# Altium footprint library Connectors.PCBLIB: 126 footprints (part 4 of 8)
Each footprint in its own frame and in the unit in brackets; x right, y up, seen from the top. Pads: shape width x height; smd on the part's side, far side on the other; paste and mask are expansions set on the pad; w line width, h text height; cw(c..) or ccw(c..) is an arc to the next point about the centre after c.
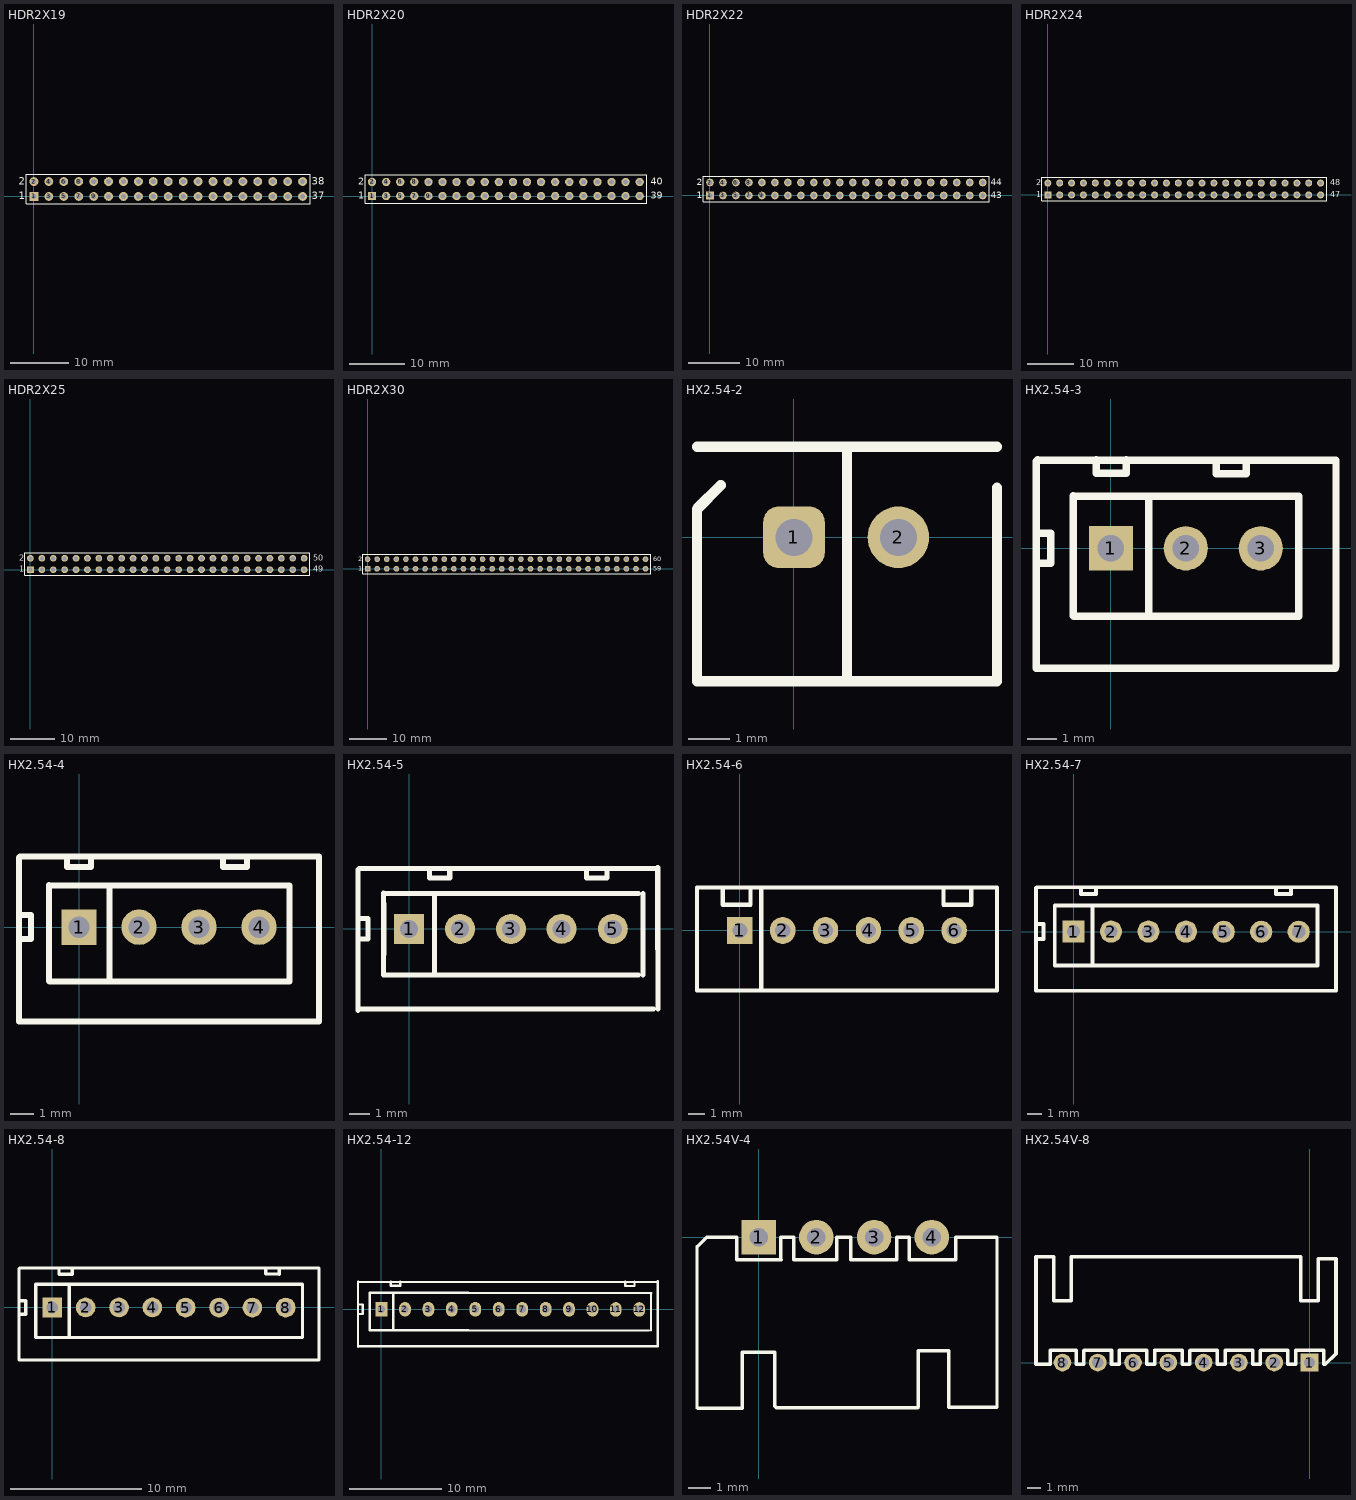
[diagram p3: the footprints below, top view; thin cyan lines are the x and y axes]

## HDR2X19 [mm] "Connector; Header; 19x2 Position"
pads (38):
  rect 1.5x1.5 hole 0.9: 1(0,0)
  round 1.5 hole 0.9: 2(0,2.54) 3(2.54,0) 4(2.54,2.54) 5(5.08,0) 6(5.08,2.54) 7(7.62,0) 8(7.62,2.54) 9(10.16,0) 10(10.16,2.54) 11(12.7,0) 12(12.7,2.54) 13(15.24,0) 14(15.24,2.54) 15(17.78,0) 16(17.78,2.54) 17(20.32,0) 18(20.32,2.54) 19(22.86,0) 20(22.86,2.54) 21(25.4,0) 22(25.4,2.54) 23(27.94,0) 24(27.94,2.54) 25(30.48,0) 26(30.48,2.54) 27(33.02,0) 28(33.02,2.54) 29(35.56,0) 30(35.56,2.54) 31(38.1,0) 32(38.1,2.54) 33(40.64,0) 34(40.64,2.54) 35(43.18,0) 36(43.18,2.54) 37(45.72,0) 38(45.72,2.54)
Top Overlay:
  lines w0.2: -1.27,-1.27 46.99,-1.27 46.99,3.81 -1.27,3.81 -1.27,-1.27
  text "2" at -2.54,2.032 h1.27
  text "1" at -2.54,-0.508 h1.27
  text "37" at 47.244,-0.508 h1.27
  text "38" at 47.244,2.032 h1.27
3D body "HDR2x19.STEP": height 8.54, standoff -3, extent -1.27,-1.27 46.99,3.81

## HDR2X20 [mm] "Connector; Header; 20x2 Position"
pads (40):
  rect 1.5x1.5 hole 0.9: 1(0,0)
  round 1.5 hole 0.9: 2(0,2.54) 3(2.54,0) 4(2.54,2.54) 5(5.08,0) 6(5.08,2.54) 7(7.62,0) 8(7.62,2.54) 9(10.16,0) 10(10.16,2.54) 11(12.7,0) 12(12.7,2.54) 13(15.24,0) 14(15.24,2.54) 15(17.78,0) 16(17.78,2.54) 17(20.32,0) 18(20.32,2.54) 19(22.86,0) 20(22.86,2.54) 21(25.4,0) 22(25.4,2.54) 23(27.94,0) 24(27.94,2.54) 25(30.48,0) 26(30.48,2.54) 27(33.02,0) 28(33.02,2.54) 29(35.56,0) 30(35.56,2.54) 31(38.1,0) 32(38.1,2.54) 33(40.64,0) 34(40.64,2.54) 35(43.18,0) 36(43.18,2.54) 37(45.72,0) 38(45.72,2.54) 39(48.26,0) 40(48.26,2.54)
Top Overlay:
  lines w0.2: -1.27,-1.27 49.53,-1.27 49.53,3.81 -1.27,3.81 -1.27,-1.27
  text "1" at -2.54,-0.508 h1.27
  text "2" at -2.54,2.032 h1.27
  text "40" at 50.292,2.032 h1.27
  text "39" at 50.292,-0.508 h1.27
3D body "HDR2x20.STEP": height 8.54, standoff -3, extent -1.27,-1.27 49.53,3.81

## HDR2X22 [mm] "Connector; Header; 22x2 Position"
pads (44):
  rect 1.5x1.5 hole 0.9: 1(0,0)
  round 1.5 hole 0.9: 2(0,2.54) 3(2.54,0) 4(2.54,2.54) 5(5.08,0) 6(5.08,2.54) 7(7.62,0) 8(7.62,2.54) 9(10.16,0) 10(10.16,2.54) 11(12.7,0) 12(12.7,2.54) 13(15.24,0) 14(15.24,2.54) 15(17.78,0) 16(17.78,2.54) 17(20.32,0) 18(20.32,2.54) 19(22.86,0) 20(22.86,2.54) 21(25.4,0) 22(25.4,2.54) 23(27.94,0) 24(27.94,2.54) 25(30.48,0) 26(30.48,2.54) 27(33.02,0) 28(33.02,2.54) 29(35.56,0) 30(35.56,2.54) 31(38.1,0) 32(38.1,2.54) 33(40.64,0) 34(40.64,2.54) 35(43.18,0) 36(43.18,2.54) 37(45.72,0) 38(45.72,2.54) 39(48.26,0) 40(48.26,2.54) 41(50.8,0) 42(50.8,2.54) 43(53.34,0) 44(53.34,2.54)
Top Overlay:
  lines w0.2: -1.27,-1.27 -1.27,3.81 54.61,3.81 54.61,-1.27 -1.27,-1.27
  text "43" at 54.864,-0.508 h1.27
  text "44" at 54.864,2.032 h1.27
  text "1" at -2.54,-0.508 h1.27
  text "2" at -2.54,2.032 h1.27
3D body "HDR2x22.STEP": height 8.54, standoff -3, extent -1.27,-1.27 54.61,3.81

## HDR2X24 [mm] "Connector; Header; 24x2 Position"
pads (48):
  rect 1.5x1.5 hole 0.9: 1(0,0)
  round 1.5 hole 0.9: 2(0,2.54) 3(2.54,0) 4(2.54,2.54) 5(5.08,0) 6(5.08,2.54) 7(7.62,0) 8(7.62,2.54) 9(10.16,0) 10(10.16,2.54) 11(12.7,0) 12(12.7,2.54) 13(15.24,0) 14(15.24,2.54) 15(17.78,0) 16(17.78,2.54) 17(20.32,0) 18(20.32,2.54) 19(22.86,0) 20(22.86,2.54) 21(25.4,0) 22(25.4,2.54) 23(27.94,0) 24(27.94,2.54) 25(30.48,0) 26(30.48,2.54) 27(33.02,0) 28(33.02,2.54) 29(35.56,0) 30(35.56,2.54) 31(38.1,0) 32(38.1,2.54) 33(40.64,0) 34(40.64,2.54) 35(43.18,0) 36(43.18,2.54) 37(45.72,0) 38(45.72,2.54) 39(48.26,0) 40(48.26,2.54) 41(50.8,0) 42(50.8,2.54) 43(53.34,0) 44(53.34,2.54) 45(55.88,0) 46(55.88,2.54) 47(58.42,0) 48(58.42,2.54)
Top Overlay:
  lines w0.2: -1.27,-1.27 -1.27,3.81 59.69,3.81 59.69,-1.27 -1.27,-1.27
  text "47" at 60.452,-0.508 h1.27
  text "48" at 60.452,2.032 h1.27
  text "1" at -2.54,-0.508 h1.27
  text "2" at -2.54,2.032 h1.27
3D body "HDR2x24.STEP": height 8.54, standoff -3, extent -1.27,-1.27 59.69,3.81

## HDR2X25 [mm] "Connector; Header; 25x2 Position"
pads (50):
  rect 1.5x1.5 hole 0.9: 1(0,0)
  round 1.5 hole 0.9: 2(0,2.54) 3(2.54,0) 4(2.54,2.54) 5(5.08,0) 6(5.08,2.54) 7(7.62,0) 8(7.62,2.54) 9(10.16,0) 10(10.16,2.54) 11(12.7,0) 12(12.7,2.54) 13(15.24,0) 14(15.24,2.54) 15(17.78,0) 16(17.78,2.54) 17(20.32,0) 18(20.32,2.54) 19(22.86,0) 20(22.86,2.54) 21(25.4,0) 22(25.4,2.54) 23(27.94,0) 24(27.94,2.54) 25(30.48,0) 26(30.48,2.54) 27(33.02,0) 28(33.02,2.54) 29(35.56,0) 30(35.56,2.54) 31(38.1,0) 32(38.1,2.54) 33(40.64,0) 34(40.64,2.54) 35(43.18,0) 36(43.18,2.54) 37(45.72,0) 38(45.72,2.54) 39(48.26,0) 40(48.26,2.54) 41(50.8,0) 42(50.8,2.54) 43(53.34,0) 44(53.34,2.54) 45(55.88,0) 46(55.88,2.54) 47(58.42,0) 48(58.42,2.54) 49(60.96,0) 50(60.96,2.54)
Top Overlay:
  lines w0.2: -1.27,-1.27 62.23,-1.27 62.23,3.81 -1.27,3.81 -1.27,-1.27
  text "50" at 62.992,2.032 h1.27
  text "49" at 62.992,-0.508 h1.27
  text "1" at -2.54,-0.508 h1.27
  text "2" at -2.54,2.032 h1.27
3D body "HDR2x25.STEP": height 8.54, standoff -3, extent -1.27,-1.27 62.23,3.81

## HDR2X30 [mm] "Connector; Header; 30x2 Position"
pads (60):
  rect 1.5x1.5 hole 0.9: 1(0,0)
  round 1.5 hole 0.9: 2(0,2.54) 3(2.54,0) 4(2.54,2.54) 5(5.08,0) 6(5.08,2.54) 7(7.62,0) 8(7.62,2.54) 9(10.16,0) 10(10.16,2.54) 11(12.7,0) 12(12.7,2.54) 13(15.24,0) 14(15.24,2.54) 15(17.78,0) 16(17.78,2.54) 17(20.32,0) 18(20.32,2.54) 19(22.86,0) 20(22.86,2.54) 21(25.4,0) 22(25.4,2.54) 23(27.94,0) 24(27.94,2.54) 25(30.48,0) 26(30.48,2.54) 27(33.02,0) 28(33.02,2.54) 29(35.56,0) 30(35.56,2.54) 31(38.1,0) 32(38.1,2.54) 33(40.64,0) 34(40.64,2.54) 35(43.18,0) 36(43.18,2.54) 37(45.72,0) 38(45.72,2.54) 39(48.26,0) 40(48.26,2.54) 41(50.8,0) 42(50.8,2.54) 43(53.34,0) 44(53.34,2.54) 45(55.88,0) 46(55.88,2.54) 47(58.42,0) 48(58.42,2.54) 49(60.96,0) 50(60.96,2.54) 51(63.5,0) 52(63.5,2.54) 53(66.04,0) 54(66.04,2.54) 55(68.58,0) 56(68.58,2.54) 57(71.12,0) 58(71.12,2.54) 59(73.66,0) 60(73.66,2.54)
Top Overlay:
  lines w0.2: -1.27,-1.27 75.06,-1.27 75.06,3.81 -1.27,3.81 -1.27,-1.27
  text "60" at 75.692,2.032 h1.27
  text "59" at 75.692,-0.508 h1.27
  text "1" at -2.54,-0.508 h1.27
  text "2" at -2.54,2.032 h1.27
Bottom Overlay:
  text "1" at -55.88,-0.508 h1.27
3D body "HDR2x30.STEP": height 8.54, standoff -3, extent -1.27,-1.27 74.93,3.81

## HX2.54-2 [mm] "两针白色插座（已加焊）"
pads (2):
  rrect50% 1.5x1.5 hole 0.9: 1(0,0)
  round 1.5 hole 0.9: 2(2.54,0)
Top Overlay:
  lines w0.254: -2.36,2.2 4.94,2.2 ; -1.778,1.27 -2.36,0.688 -2.36,0.635 -2.36,-3.5 4.94,-3.5 4.94,1.206 ; 1.29,-3.5 1.29,2.2
3D body "SIP2_Y.stp": height 7, standoff -3, extent -2.48,-3.55 5.02,2.45

## HX2.54-3 [mm]
pads (3):
  rect 1.5x1.5 hole 0.9: 1(0,0)
  round 1.5 hole 0.9: 2(2.54,0) 3(5.08,0)
Top Overlay:
  lines w0.254: -2.54,-0.508 -2.032,-0.508 -2.032,0.508 -2.54,0.508 ; -2.536,2.54 -2.536,2.95 ; -2.496,2.995 7.633,2.995 7.633,-4.005 ; -1.27,-2.286 -1.27,1.778 ; -1.257,-2.296 6.363,-2.296 ; -1.257,1.768 6.375,1.768 ; -0.504,2.998 -0.504,2.538 0.512,2.538 0.512,2.998 ; 1.283,-2.296 1.283,1.768 ; 3.573,2.995 3.573,2.535 4.589,2.535 4.589,2.995 ; 6.375,-2.299 6.375,1.765 ; 7.607,-4.061 -2.536,-4.061 -2.536,2.95 ; -2.536,2.95 -2.488,2.998 -2.536,2.95
3D body "hx254-3tl_y.stp": height 7, standoff -3, extent -2.409,-3.581 7.591,2.419

## HX2.54-4 [mm]
pads (4):
  rect 1.5x1.5 hole 0.9: 1(0,0)
  round 1.5 hole 0.9: 2(2.54,0) 3(5.08,0) 4(7.62,0)
Top Overlay:
  lines w0.254: -2.54,-0.508 -2.032,-0.508 -2.032,0.508 -2.54,0.508 ; -2.536,-4.002 -2.536,2.95 ; -2.472,-4.002 -2.092,-4.002 10.16,-4.002 10.16,2.998 -2.488,2.998 ; -1.27,-2.286 -1.27,1.778 ; -1.257,-2.296 8.903,-2.296 8.903,1.768 -1.257,1.768 ; -0.504,2.998 -0.504,2.538 0.512,2.538 0.512,2.998 ; 1.283,-2.296 1.283,1.768 ; 6.1,2.998 6.1,2.538 7.116,2.538 7.116,2.998 ; -2.536,2.95 -2.488,2.998 ; -2.536,2.95 -2.488,2.998
3D body "hx254-4tl_y.stp": height 7, standoff -3, extent -2.399,-3.562 10.121,2.438

## HX2.54-5 [mm]
pads (5):
  rect 1.5x1.5 hole 0.9: 1(0,0)
  round 1.5 hole 0.9: 2(2.54,0) 3(5.08,0) 4(7.607,0.006) 5(10.16,0)
Top Overlay:
  lines w0.254: -2.553,-0.502 -2.045,-0.502 -2.045,0.514 -2.553,0.514 ; -2.491,-3.996 12.179,-3.996 ; -2.104,-3.996 -2.484,-3.996 -2.548,-4.06 -2.548,-2.028 -2.548,2.956 -2.5,3.004 12.416,3.014 ; -1.283,-2.28 -1.283,1.784 ; -1.27,-2.29 11.43,-2.29 ; -1.27,-1.27 -1.27,1.27 ; -1.27,1.774 11.43,1.774 ; 1.008,3.004 1.008,2.544 2.024,2.544 2.024,3.004 ; 1.27,-2.29 1.27,1.774 ; 1.27,-1.27 1.27,1.27 ; 8.856,3.004 8.856,2.544 9.872,2.544 9.872,3.004 ; 11.659,-2.29 11.659,1.774 ; 12.403,-1.01 12.403,3.054 ; 12.408,-3.996 12.408,0.004
3D body "hx254-5tl_y.stp": height 7.51, standoff -2.49, extent -2.562,-3.562 12.518,2.438

## HX2.54-6 [mm]
pads (6):
  rect 1.5x1.6 hole 0.9: 1(0,0)
  oval 1.5x1.6 hole 0.9: 2(2.54,0) 3(5.08,0) 4(7.62,0) 5(10.16,0) 6(12.7,0)
Top Overlay:
  lines w0.254: -1.016,2.54 -1.016,1.524 0.635,1.524 0.635,2.54 ; 1.27,-3.556 1.27,2.54 ; 12.065,2.54 12.065,1.524 13.716,1.524 13.716,2.54 ; -2.54,-3.556 15.24,-3.556 15.24,2.54 -2.54,2.54 -2.54,-3.556
3D body "HDR2.54x6.STEP": height 6.1, standoff -2, extent -2.54,-3.632 15.24,2.362

## HX2.54-7 [mm]
pads (7):
  rect 1.5x1.5 hole 0.9: 1(0,0)
  round 1.5 hole 0.9: 2(2.54,0) 3(5.08,0) 4(7.62,0) 5(10.173,-0.01) 6(12.713,-0.01) 7(15.253,-0.01)
Top Overlay:
  lines w0.254: -2.54,-0.508 -2.032,-0.508 -2.032,0.508 -2.54,0.508 ; -1.257,-2.296 16.523,-2.296 16.523,1.768 -1.257,1.768 ; 0.512,2.998 0.512,2.538 1.528,2.538 1.528,2.998 ; 1.283,-2.296 1.283,1.768 ; 9.398,-2.286 -1.27,-2.286 -1.27,1.778 9.398,1.778 ; 13.72,2.998 13.72,2.538 14.736,2.538 14.736,2.998 ; 17.776,-4.002 17.776,2.998 ; 17.78,-4.002 -2.536,-4.002 -2.536,2.95 -2.488,2.998 17.78,2.998
3D body "HDR2.54x7.STEP": height 6.1, standoff -2, extent -2.535,-3.632 17.776,2.362

## HX2.54-8 [mm]
pads (8):
  rect 1.5x1.5 hole 0.9: 1(0,0)
  round 1.5 hole 0.9: 2(2.54,0) 3(5.08,0) 4(7.62,0) 5(10.16,-0.01) 6(12.7,-0.01) 7(15.24,-0.01) 8(17.78,-0.01)
Top Overlay:
  lines w0.254: -2.54,-0.508 -2.032,-0.508 -2.032,0.508 -2.54,0.508 ; 0.512,2.998 0.512,2.538 1.528,2.538 1.528,2.998 ; 1.283,-2.296 1.283,1.768 ; 16.256,3 16.256,2.54 17.272,2.54 ; 17.276,2.538 17.276,2.998 ; 19.063,-2.296 19.063,1.768 ; 19.063,-2.286 -1.27,-2.286 -1.27,1.778 19.063,1.778 ; -2.536,-4.002 20.316,-4.002 20.316,2.998 -2.488,2.998 -2.536,2.95 -2.536,-4.002
3D body "HDR2.54x8.STEP": height 6.1, standoff -2, extent -2.54,-3.632 20.32,2.362

## HX2.54-12 [mil]
pads (12):
  rect 50x62 hole 32: 1(0,0)
  oval 50x62 hole 32: 2(100.5,0.5) 3(200.5,0.5) 4(300,0.73) 5(400.5,0.5) 6(500.5,0.5) 7(600.5,0.5) 8(700.5,0.5) 9(800.5,0.5) 10(900.5,0.5) 11(1000,0) 12(1100,0)
Top Overlay:
  lines w10: -100,-19.26 -80,-19.26 -80,20.74 -100,20.74 ; -97.94,118.76 -99.83,116.87 ; -97.57,-156.83 1180,-156.83 ; -82.35,-156.83 -97.31,-156.83 -99.83,-159.35 -99.83,-79.35 -99.83,116.87 ; -49.5,-89.66 1141,-89.66 ; -49.5,70.34 1150.5,70.34 ; 40.17,118.76 40.17,100.65 80.17,100.65 80.17,118.76 ; 50.5,-89.66 50.5,70.34 ; 370,-89.26 -50,-89.26 -50,70.74 370,70.74 ; 1039.67,118.26 1039.67,100.15 1079.67,100.15 1079.67,118.26 ; 1150,-90.16 1150,69.84 ; 1175.96,116.87 -99.83,116.87 ; 1179.33,-39.76 1179.33,120.24 ; 1179.5,-157.33 1179.5,0.15 ; -49.5,-49.5 -49.5,50.5 -49.5,-49.5 ; 50.5,-49.5 50.5,50.5 50.5,-49.5
3D body "HDR2.54x12.STEP": height 240, standoff -78.74, extent -100,-143 1180,93

## HX2.54V-4 [mil]
pads (4):
  rect 60x60 hole 32: 1(0,0)
  round 60 hole 32: 2(100,0) 3(200,0) 4(300,0)
Top Overlay:
  lines w6.06: 26.14,-199.13 -28.11,-199.13 -28.11,-296.38 -105.91,-296.38 -106.93,-295.35 -106.93,-16.93 -103.07,-13.07 -90,0 -38.35,0 -38.35,-38.66 -37.8,-39.21 39.21,-39.21 38.66,-38.66 38.66,0 61.18,0 61.18,-39.45 134.65,-39.45 135.2,-38.9 135.2,0 ; 28.19,-199.13 28.19,-293.31 30.24,-295.35 275.91,-295.35 276.93,-294.33 276.93,-198.11 ; 135.67,0 159.21,0 ; 159.76,-39.21 159.76,0 ; 160.55,-39.21 238.82,-39.21 239.06,-38.98 239.06,0 260.55,0 ; 261.1,0 261.1,-39.45 341.97,-39.45 ; 276.93,-197.09 329.13,-197.09 329.61,-197.56 329.61,-294.88 413.07,-294.88 413.07,0 343.54,0 ; 341.97,-38.43 341.97,0
3D body "HDR2.54xV4.STEP": height 236.11, standoff -78.63, extent -104.99,-299.99 415.01,10.76

## HX2.54V-8 [mil]
pads (8):
  rect 50x50 hole 32: 1(0,0)
  round 50 hole 32: 2(-100,0) 3(-200,0) 4(-300,0) 5(-400,0) 6(-500,0) 7(-600,0) 8(-700,0)
Top Overlay:
  lines w10: -661.1,-5 -661.1,34.45 -735,34.45 -735,30 -735,-5 -775,-5 -775,300 -725,300 -725,175 -675,175 -675,300 -25,300 -25,175 25,175 25,294.67 75,294.67 75,25 45,-5 40,-5 40,35 -39.06,35 -39.06,-5 -60.55,-5 ; -660.55,-5 -639.06,-5 -639.06,33.98 -638.58,34.45 -561.1,34.45 -561.1,-5 ; -560.55,-5 -539.06,-5 -539.06,33.98 -538.58,34.45 -461.1,34.45 -461.1,-5 ; -460.55,-5 -439.06,-5 -439.06,33.98 -438.58,34.45 -361.1,34.45 -361.1,-5 ; -360.55,-5 -339.06,-5 -339.06,33.98 -338.58,34.45 -261.1,34.45 -261.1,-5 ; -260.55,-5 -239.06,-5 -239.06,33.98 -238.58,34.45 -161.1,34.45 -161.1,-5 ; -160.55,-5 -139.06,-5 -139.06,33.98 -138.58,34.45 -61.1,34.45 -61.1,-5
3D body "HDR2.54xV8.STEP": height 236.11, standoff -78.63, extent -774.99,-10.74 75,300.01